# Altium footprint library Miscellaneous Connectors.PcbLib: 242 footprints (part 16 of 16)
Each footprint in its own frame and in the unit in brackets; x right, y up, seen from the top. Pads: shape width x height; smd on the part's side, far side on the other; paste and mask are expansions set on the pad; w line width, h text height; cw(c..) or ccw(c..) is an arc to the next point about the centre after c.
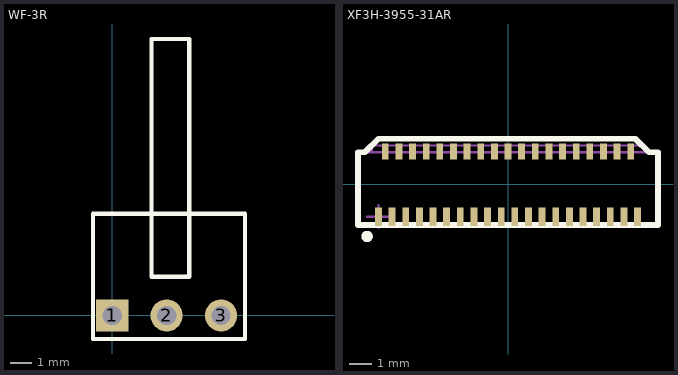
[diagram p15: the footprints below, top view; thin cyan lines are the x and y axes]

## WF-3R [mm] "Connector; Header; 3 Position"
pads (3):
  rect 1.5x1.5 hole 0.9: 1(0,0)
  round 1.5 hole 0.9: 2(2.54,0) 3(5.08,0)
Top Overlay:
  lines w0.2: -0.9,-1.1 6.2,-1.1 6.2,4.75 -0.9,4.75 -0.9,-1.1 ; 1.83,1.8 3.6,1.8 3.6,12.9 1.83,12.9 1.83,1.8
3D body "User Library-WF-2R.step": height 5.8, standoff -3.4, extent 0.12,-0.3 5.2,12.9

## XF3H-3955-31AR [mm] "Connector; FPC/FFC, SM, 50 Position, Right Angle, Pitch 0.3mm"
height 2
pads (39):
  rect 0.3x0.8 smd: 1(-5.7,-1.432) 3(-5.1,-1.432) 5(-4.5,-1.432) 7(-3.9,-1.432) 9(-3.3,-1.432) 11(-2.7,-1.432) 13(-2.1,-1.432) 15(-1.5,-1.432) 17(-0.9,-1.432) 19(-0.3,-1.432) 21(0.3,-1.432) 23(0.9,-1.432) 25(1.5,-1.432) 27(2.1,-1.432) 29(2.7,-1.432) 31(3.3,-1.432) 33(3.9,-1.432) 35(4.5,-1.432) 37(5.1,-1.432) 39(5.7,-1.432)
  rect 0.3x0.7 smd: 2(-5.4,1.433) 4(-4.8,1.433) 6(-4.2,1.433) 8(-3.6,1.433) 10(-3,1.433) 12(-2.4,1.433) 14(-1.8,1.433) 16(-1.2,1.433) 18(-0.6,1.433) 20(0,1.433) 22(0.6,1.433) 24(1.2,1.433) 26(1.8,1.433) 28(2.4,1.433) 30(3,1.433) 32(3.6,1.433) 34(4.2,1.433) 36(4.8,1.433) 38(5.4,1.433)
Top Overlay:
  circle w0.25: c-6.2,-2.3 r0.125
  lines w0.254: -6.6,-1.8 6.6,-1.8 6.6,1.4 6.2,1.4 5.6,2 -5.7,2 -6.3,1.4 -6.6,1.4 -6.6,-1.8
Mechanical 13:
  lines w0.1: -6,1.4 -6,1.7 6,1.7 6,1.4 ; -6.6,-1.75 6.6,-1.75 6.6,1.4 -6.6,1.4 -6.6,-1.75
Mechanical 15:
  lines w0.1: -6.2,-1.432 -5.2,-1.432 ; -5.7,-1.932 -5.7,-0.932